# Altium footprint library SparkFun.PCBLIB: 674 footprints (part 27 of 44)
Each footprint in its own frame and in the unit in brackets; x right, y up, seen from the top. Pads: shape width x height; smd on the part's side, far side on the other; paste and mask are expansions set on the pad; w line width, h text height; cw(c..) or ccw(c..) is an arc to the next point about the centre after c.
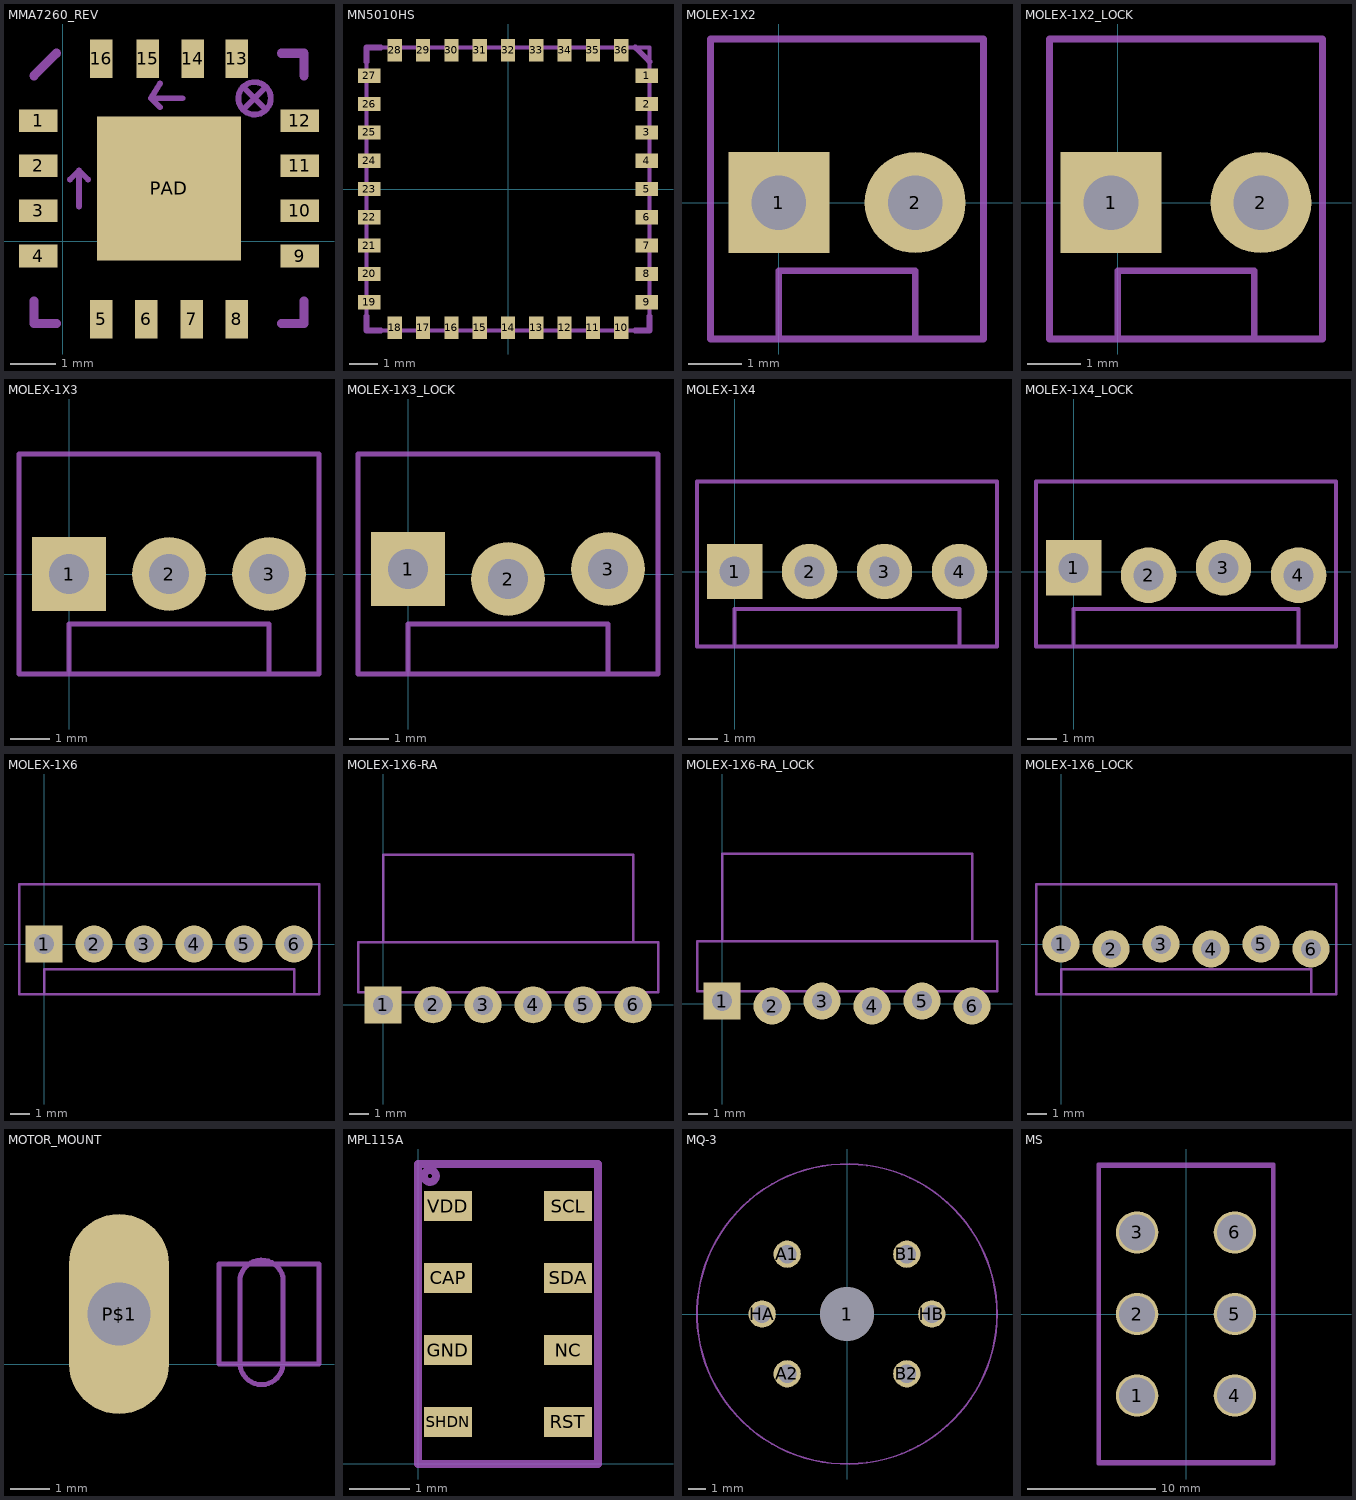
[diagram p26: the footprints below, top view; thin cyan lines are the x and y axes]

## MMA7260_REV [mil]
pads (17):
  rect 33.65x19.69 smd: 1(-21.27,105.06) 2(-21.27,65.69) 3(-21.27,26.32) 4(-21.27,-13.06) 9(207.27,-13.06) 10(207.27,26.32) 11(207.27,65.69) 12(207.27,105.06)
  rect 19.69x33.65 smd: 5(33.94,-68.27) 6(73.32,-68.27) 7(112.69,-68.27) 8(152.06,-68.27) 13(152.06,159.27) 14(113.69,159.27) 15(74.32,159.27) 16(33.94,159.27)
  rect 125.98x125.98 smd paste-62.99: PAD(93,46)
Top Paste:
  rectangle: 78.24,30.24 107.76,59.76
Mechanical 2:
  lines w8: -25.11,-52.43 -25.11,-72.11 -5.43,-72.11 ; -25.11,144.43 -5.43,164.11 ; 191.43,-72.11 211.11,-72.11 211.11,-52.43 ; 191.43,164.11 211.11,164.11 211.11,144.43
Mechanical 18:
  circle w5: c167.8,124.74 r14.19
  lines w5: 6.39,53.87 14.26,61.75 ; 14.26,30.25 14.26,61.75 ; 22.13,53.87 14.26,61.75 ; 85.13,116.87 77.25,124.74 ; 85.13,137.61 77.25,124.74 ; 104.81,124.74 77.25,124.74 ; 159.93,116.87 175.68,132.61 ; 159.93,132.61 175.68,116.87

## MN5010HS [mil]
pads (36):
  rect 31.5x19.69 smd: 1(192.91,157.48) 2(192.91,118.11) 3(192.91,78.74) 4(192.91,39.37) 5(192.91,0) 6(192.91,-39.37) 7(192.91,-78.74) 8(192.91,-118.11) 9(192.91,-157.48) 19(-192.91,-157.48) 20(-192.91,-118.11) 21(-192.91,-78.74) 22(-192.91,-39.37) 23(-192.91,0) 24(-192.91,39.37) 25(-192.91,78.74) 26(-192.91,118.11) 27(-192.91,157.48)
  rect 19.69x31.5 smd: 10(157.48,-192.91) 11(118.11,-192.91) 12(78.74,-192.91) 13(39.37,-192.91) 14(0,-192.91) 15(-39.37,-192.91) 16(-78.74,-192.91) 17(-118.11,-192.91) 18(-157.48,-192.91) 28(-157.48,192.91) 29(-118.11,192.91) 30(-78.74,192.91) 31(-39.37,192.91) 32(0,192.91) 33(39.37,192.91) 34(78.74,192.91) 35(118.11,192.91) 36(157.48,192.91)
Mechanical 2:
  lines w8: -196.85,-177.17 -196.85,-196.85 -177.17,-196.85 ; -196.85,177.17 -196.85,196.85 -177.17,196.85 ; 177.17,-196.85 196.85,-196.85 196.85,-177.17 ; 177.17,196.85 196.85,177.17
Mechanical 18:
  lines w5: -196.85,-196.85 -196.85,196.85 196.85,196.85 196.85,-196.85 -196.85,-196.85

## MOLEX-1X2 [mil]
pads (2):
  rect 74x74 hole 40: 1(0,0)
  round 74 hole 40: 2(100,0)
Mechanical 2:
  lines w5: 0,-100 100,-100 ; 0,-100 -50,-100 -50,120 150,120 150,-100 100,-100 ; 0,-100 0,-50 100,-50 100,-100

## MOLEX-1X2_LOCK [mil]
pads (2):
  rect 74x74 hole 40: 1(-5,0)
  round 74 hole 40: 2(105,0)
Mechanical 2:
  lines w5: 0,-100 100,-100 ; 0,-100 -50,-100 -50,120 150,120 150,-100 100,-100 ; 0,-100 0,-50 100,-50 100,-100
Mechanical 18:
  rectangle: -11.5,-11.5 11.5,11.5
  rectangle: 88.5,-11.5 111.5,11.5

## MOLEX-1X3 [mil]
pads (3):
  rect 74x74 hole 40: 1(0,0)
  round 74 hole 40: 2(100,0) 3(200,0)
Mechanical 2:
  lines w5: 0,-100 200,-100 ; 0,-100 -50,-100 -50,120 250,120 250,-100 200,-100 ; 0,-100 0,-50 200,-50 200,-100

## MOLEX-1X3_LOCK [mil]
pads (3):
  rect 74x74 hole 40: 1(0,5)
  round 74 hole 40: 2(100,-5) 3(200,5)
Mechanical 2:
  lines w5: 0,-100 200,-100 ; 0,-100 -50,-100 -50,120 250,120 250,-100 200,-100 ; 0,-100 0,-50 200,-50 200,-100
Mechanical 18:
  rectangle: -11.5,-11.5 11.5,11.5
  rectangle: 88.5,-11.5 111.5,11.5
  rectangle: 188.5,-11.5 211.5,11.5

## MOLEX-1X4 [mil]
pads (4):
  rect 74x74 hole 40: 1(0,0)
  round 74 hole 40: 2(100,0) 3(200,0) 4(300,0)
Mechanical 2:
  lines w5: 0,-100 300,-100 ; 0,-100 -50,-100 -50,120 350,120 350,-100 300,-100 ; 0,-100 0,-50 300,-50 300,-100

## MOLEX-1X4_LOCK [mil]
pads (4):
  rect 74x74 hole 40: 1(0,5)
  round 74 hole 40: 2(100,-5) 3(200,5) 4(300,-5)
Mechanical 2:
  lines w5: 0,-100 300,-100 ; 0,-100 -50,-100 -50,120 350,120 350,-100 300,-100 ; 0,-100 0,-50 300,-50 300,-100

## MOLEX-1X6 [mil]
pads (6):
  rect 74x74 hole 40: 1(0,0)
  round 74 hole 40: 2(100,0) 3(200,0) 4(300,0) 5(400,0) 6(500,0)
Mechanical 2:
  lines w5: 0,-100 500,-100 ; 0,-100 -50,-100 -50,120 550,120 550,-100 500,-100 ; 0,-100 0,-50 500,-50 500,-100

## MOLEX-1X6-RA [mil]
pads (6):
  rect 74x74 hole 40: 1(0,0)
  round 74 hole 40: 2(100,0) 3(200,0) 4(300,0) 5(400,0) 6(500,0)
Mechanical 2:
  lines w5: 0,125 500,125 ; 0,125 -50,125 -50,25 550,25 550,125 500,125 ; 0,125 0,300 500,300 500,125

## MOLEX-1X6-RA_LOCK [mil]
pads (6):
  rect 74x74 hole 40: 1(0,5)
  round 74 hole 40: 2(100,-5) 3(200,5) 4(300,-5) 5(400,5) 6(500,-5)
Mechanical 2:
  lines w5: 0,125 500,125 ; 0,125 -50,125 -50,25 550,25 550,125 500,125 ; 0,125 0,300 500,300 500,125

## MOLEX-1X6_LOCK [mil]
pads (6):
  round 74 hole 40: 1(0,0) 2(100,-10) 3(200,0) 4(300,-10) 5(400,0) 6(500,-10)
Mechanical 2:
  lines w5: 0,-100 500,-100 ; 0,-100 -50,-100 -50,120 550,120 550,-100 500,-100 ; 0,-100 0,-50 500,-50 500,-100
Mechanical 18:
  rectangle: -11.5,-16.5 11.5,6.5
  rectangle: 88.5,-16.5 111.5,6.5
  rectangle: 188.5,-16.5 211.5,6.5
  rectangle: 288.5,-16.5 311.5,6.5
  rectangle: 388.5,-16.5 411.5,6.5
  rectangle: 488.5,-16.5 511.5,6.5

## MOTOR_MOUNT [mil]
pads (1):
  oval 100x200 hole 62.99: P$1(-250,50)
Mechanical 1:
  lines w5: -129,85 -129,-1 ccw(c-107.5,1) -86,3 ; -129,86 cw(c-107.4,82) -86,87 -86,3 ; -86,0 -86,3
Mechanical 13:
  lines w5: -150,0 -50,0 -50,100 -150,100 -150,0
Via Holes:
  lines w35: -150,84 -150,0 ccw(c-107.51,1.5) -65,2 ; -150,86 cw(c-107.54,81.82) -65,85 ; -65,0 -65,2 ; -65,84 -65,2

## MPL115A [mil]
pads (8):
  rect 31.5x19.69 smd: CAP(19.69,122.05) GND(19.69,74.8) NC(98.43,74.8) RST(98.43,27.56) SCL(98.43,169.29) SDA(98.43,122.05) SHDN(19.69,27.56) VDD(19.69,169.29)
Mechanical 1:
  circle w5: c7.87,188.98 r3.94
  lines w5: 0,0 0,196.85 118.11,196.85 118.11,0 0,0

## MQ-3 [mil]
pads (7):
  round 118.11 hole 118.11: 1(0,0)
  round 60 hole 40: A1(-131.89,131.89) A2(-131.89,-131.89) B1(131.89,131.89) B2(131.89,-131.89) HA(-187.01,0) HB(187.01,0)
Mechanical 2:
  circle w3.94: c0,0 r330.71

## MS [mil]
pads (6):
  round 130 hole 110.24: 1(-150,-250) 2(-150,0) 3(-150,250) 4(150,-250) 5(150,0) 6(150,250)
Mechanical 2:
  lines w8: -270,-460 -270,460 270,460 270,-460 -270,-460
Mechanical 18:
  lines w8: -265,-452.5 265,-452.5 265,452.5 -265,452.5 -265,-452.5